# Altium footprint library common.PcbLib: 30 footprints (part 1 of 2)
Each footprint in its own frame and in the unit in brackets; x right, y up, seen from the top. Pads: shape width x height; smd on the part's side, far side on the other; paste and mask are expansions set on the pad; w line width, h text height; cw(c..) or ccw(c..) is an arc to the next point about the centre after c.
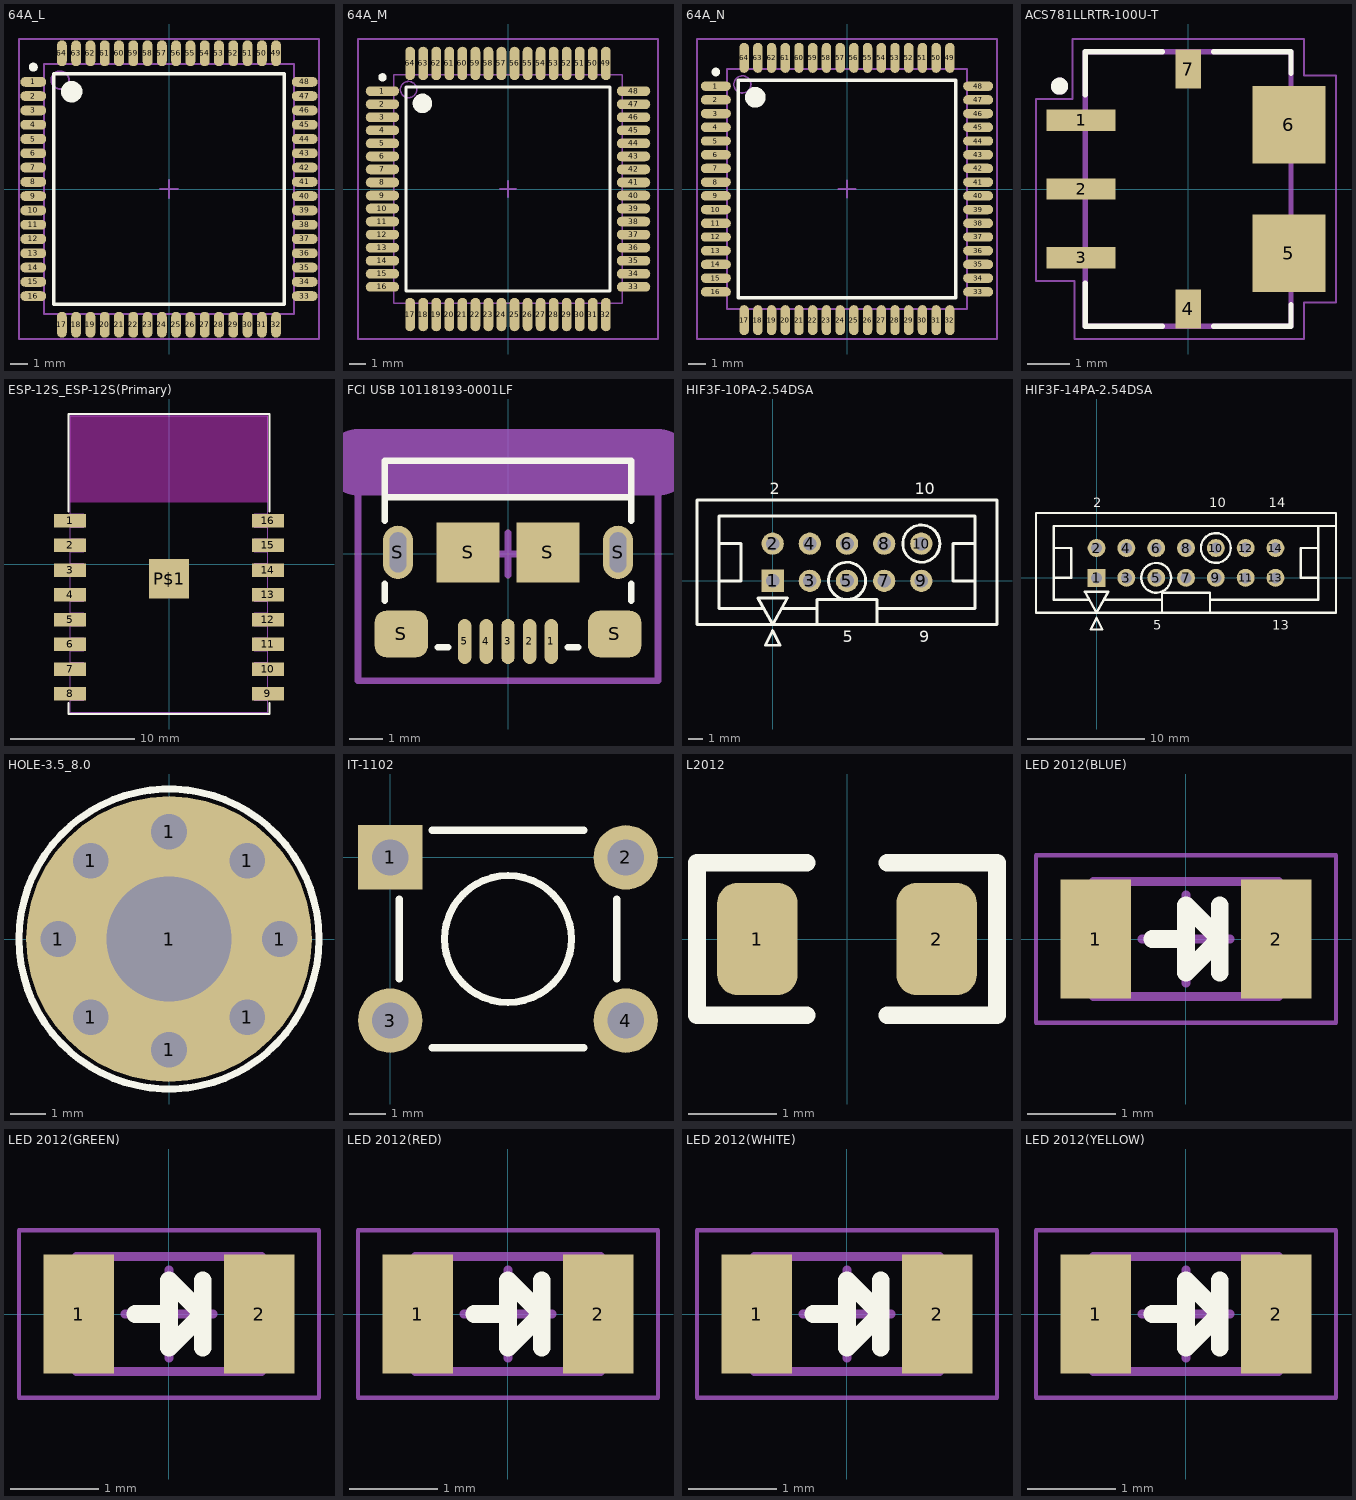
[diagram p0: the footprints below, top view; thin cyan lines are the x and y axes]

## 64A_L [mm] "64-Pin Thin Quad Flat Pack 0.8 mm Pitch, IPC High Density"
height 1.2
pads (64):
  oval 1.45x0.55 smd: 1(-7.6,6) 2(-7.6,5.2) 3(-7.6,4.4) 4(-7.6,3.6) 5(-7.6,2.8) 6(-7.6,2) 7(-7.6,1.2) 8(-7.6,0.4) 9(-7.6,-0.4) 10(-7.6,-1.2) 11(-7.6,-2) 12(-7.6,-2.8) 13(-7.6,-3.6) 14(-7.6,-4.4) 15(-7.6,-5.2) 16(-7.6,-6) 33(7.6,-6) 34(7.6,-5.2) 35(7.6,-4.4) 36(7.6,-3.6) 37(7.6,-2.8) 38(7.6,-2) 39(7.6,-1.2) 40(7.6,-0.4) 41(7.6,0.4) 42(7.6,1.2) 43(7.6,2) 44(7.6,2.8) 45(7.6,3.6) 46(7.6,4.4) 47(7.6,5.2) 48(7.6,6)
  oval 0.55x1.45 smd: 17(-6,-7.6) 18(-5.2,-7.6) 19(-4.4,-7.6) 20(-3.6,-7.6) 21(-2.8,-7.6) 22(-2,-7.6) 23(-1.2,-7.6) 24(-0.4,-7.6) 25(0.4,-7.6) 26(1.2,-7.6) 27(2,-7.6) 28(2.8,-7.6) 29(3.6,-7.6) 30(4.4,-7.6) 31(5.2,-7.6) 32(6,-7.6) 49(6,7.6) 50(5.2,7.6) 51(4.4,7.6) 52(3.6,7.6) 53(2.8,7.6) 54(2,7.6) 55(1.2,7.6) 56(0.4,7.6) 57(-0.4,7.6) 58(-1.2,7.6) 59(-2,7.6) 60(-2.8,7.6) 61(-3.6,7.6) 62(-4.4,7.6) 63(-5.2,7.6) 64(-6,7.6)
Top Overlay:
  circle w0.25: c-7.6,6.825 r0.125
  circle w0.6: c-5.45,5.45 r0.3
  lines w0.2: -6.45,-6.45 -6.45,6.45 6.45,6.45 6.45,-6.45 -6.45,-6.45
Mechanical 13:
  circle w0.1: c-6.1,6.1 r0.5
  lines w0.1: -7,-7 -7,7 7,7 7,-7 -7,-7
Mechanical 15:
  lines w0.1: -0.5,0 0.5,0 ; 0,-0.5 0,0.5 ; -8.4,-8.4 -8.4,8.4 8.4,8.4 8.4,-8.4 -8.4,-8.4
3D body: height 1.2, standoff 0, extent -7,-7 7,7

## 64A_M [mm] "64-Pin Thin Quad Flat Pack 0.8 mm Pitch, IPC Low Density"
height 1.2
pads (64):
  oval 2.05x0.6 smd: 1(-7.7,6) 2(-7.7,5.2) 3(-7.7,4.4) 4(-7.7,3.6) 5(-7.7,2.8) 6(-7.7,2) 7(-7.7,1.2) 8(-7.7,0.4) 9(-7.7,-0.4) 10(-7.7,-1.2) 11(-7.7,-2) 12(-7.7,-2.8) 13(-7.7,-3.6) 14(-7.7,-4.4) 15(-7.7,-5.2) 16(-7.7,-6) 33(7.7,-6) 34(7.7,-5.2) 35(7.7,-4.4) 36(7.7,-3.6) 37(7.7,-2.8) 38(7.7,-2) 39(7.7,-1.2) 40(7.7,-0.4) 41(7.7,0.4) 42(7.7,1.2) 43(7.7,2) 44(7.7,2.8) 45(7.7,3.6) 46(7.7,4.4) 47(7.7,5.2) 48(7.7,6)
  oval 0.6x2.05 smd: 17(-6,-7.7) 18(-5.2,-7.7) 19(-4.4,-7.7) 20(-3.6,-7.7) 21(-2.8,-7.7) 22(-2,-7.7) 23(-1.2,-7.7) 24(-0.4,-7.7) 25(0.4,-7.7) 26(1.2,-7.7) 27(2,-7.7) 28(2.8,-7.7) 29(3.6,-7.7) 30(4.4,-7.7) 31(5.2,-7.7) 32(6,-7.7) 49(6,7.7) 50(5.2,7.7) 51(4.4,7.7) 52(3.6,7.7) 53(2.8,7.7) 54(2,7.7) 55(1.2,7.7) 56(0.4,7.7) 57(-0.4,7.7) 58(-1.2,7.7) 59(-2,7.7) 60(-2.8,7.7) 61(-3.6,7.7) 62(-4.4,7.7) 63(-5.2,7.7) 64(-6,7.7)
Top Overlay:
  circle w0.25: c-7.7,6.85 r0.125
  circle w0.6: c-5.25,5.25 r0.3
  lines w0.2: -6.25,-6.25 -6.25,6.25 6.25,6.25 6.25,-6.25 -6.25,-6.25
Mechanical 13:
  circle w0.1: c-6.1,6.1 r0.5
  lines w0.1: -7,-7 -7,7 7,7 7,-7 -7,-7
Mechanical 15:
  lines w0.1: -0.5,0 0.5,0 ; 0,-0.5 0,0.5 ; -9.2,-9.2 -9.2,9.2 9.2,9.2 9.2,-9.2 -9.2,-9.2
3D body: height 1.2, standoff 0, extent -7,-7 7,7

## 64A_N [mm] "64-Pin Thin Quad Flat Pack 0.8 mm Pitch, IPC Medium Density"
height 1.2
pads (64):
  oval 1.75x0.55 smd: 1(-7.65,6) 2(-7.65,5.2) 3(-7.65,4.4) 4(-7.65,3.6) 5(-7.65,2.8) 6(-7.65,2) 7(-7.65,1.2) 8(-7.65,0.4) 9(-7.65,-0.4) 10(-7.65,-1.2) 11(-7.65,-2) 12(-7.65,-2.8) 13(-7.65,-3.6) 14(-7.65,-4.4) 15(-7.65,-5.2) 16(-7.65,-6) 33(7.65,-6) 34(7.65,-5.2) 35(7.65,-4.4) 36(7.65,-3.6) 37(7.65,-2.8) 38(7.65,-2) 39(7.65,-1.2) 40(7.65,-0.4) 41(7.65,0.4) 42(7.65,1.2) 43(7.65,2) 44(7.65,2.8) 45(7.65,3.6) 46(7.65,4.4) 47(7.65,5.2) 48(7.65,6)
  oval 0.55x1.75 smd: 17(-6,-7.65) 18(-5.2,-7.65) 19(-4.4,-7.65) 20(-3.6,-7.65) 21(-2.8,-7.65) 22(-2,-7.65) 23(-1.2,-7.65) 24(-0.4,-7.65) 25(0.4,-7.65) 26(1.2,-7.65) 27(2,-7.65) 28(2.8,-7.65) 29(3.6,-7.65) 30(4.4,-7.65) 31(5.2,-7.65) 32(6,-7.65) 49(6,7.65) 50(5.2,7.65) 51(4.4,7.65) 52(3.6,7.65) 53(2.8,7.65) 54(2,7.65) 55(1.2,7.65) 56(0.4,7.65) 57(-0.4,7.65) 58(-1.2,7.65) 59(-2,7.65) 60(-2.8,7.65) 61(-3.6,7.65) 62(-4.4,7.65) 63(-5.2,7.65) 64(-6,7.65)
Top Overlay:
  circle w0.6: c-5.35,5.35 r0.3
  circle w0.25: c-7.65,6.825 r0.125
  lines w0.2: -6.35,-6.35 6.35,-6.35 6.35,6.35 -6.35,6.35 -6.35,-6.35
Mechanical 13:
  circle w0.1: c-6.1,6.1 r0.5
  lines w0.1: -7,-7 7,-7 7,7 -7,7 -7,-7
Mechanical 15:
  lines w0.1: -0.5,0 0.5,0 ; 0,-0.5 0,0.5 ; -8.75,-8.75 8.75,-8.75 8.75,8.75 -8.75,8.75 -8.75,-8.75
3D body: height 1.2, standoff 0, extent -7,-7 7,7

## ACS781LLRTR-100U-T [mm]
pads (7):
  rect 1.6x0.5 smd: 1(-2.5,1.6) 2(-2.5,0) 3(-2.5,-1.6)
  rect 0.6x0.9 smd: 4(0,-2.8) 7(0,2.8)
  rect 1.7x1.8 smd: 5(2.35,-1.5) 6(2.35,1.5)
Top Overlay:
  circle w0.2: c-3,2.4 r0.1
  lines w0.127: -2.4,-2.2 -2.4,-3.2 -0.6,-3.2 ; -2.4,2.2 -2.4,3.2 -0.6,3.2 ; 0.6,-3.2 2.4,-3.2 2.4,-2.7 ; 0.6,3.2 2.4,3.2 2.4,2.7
Mechanical 4:
  circle w0.2: c-3,2.4 r0.1
  circle w0.2: c-3,2.4 r0.1
  lines w0.127: -2.4,-3.2 -2.4,3.2 ; -2.4,-3.2 2.4,-3.2 ; -2.4,-3.2 -2.4,3.2 ; -2.4,-3.2 2.4,-3.2 ; -2.4,3.2 2.4,3.2 ; -2.4,3.2 2.4,3.2 ; 2.4,-3.2 2.4,3.2 ; 2.4,-3.2 2.4,3.2
Mechanical 16:
  lines w0.05: -3.55,-2.15 -3.55,2.1 -2.7,2.1 -2.7,3.5 2.7,3.5 2.7,2.65 3.45,2.65 3.45,-2.65 2.7,-2.65 2.7,-3.5 -2.65,-3.5 -2.65,-2.15 -3.55,-2.15
3D body "acs781.STP": height 1.5, standoff 0, extent -3.2,-3.2 3.2,3.2

## ESP-12S_ESP-12S(Primary) [mm]
pads (17):
  rect 2.6x1.1 smd: 1(-8,3.5) 2(-8,1.5) 3(-8,-0.5) 4(-8,-2.5) 5(-8,-4.5) 6(-8,-6.5) 7(-8,-8.5) 8(-8,-10.5) 9(8,-10.5) 10(8,-8.5) 11(8,-6.5) 12(8,-4.5) 13(8,-2.5) 14(8,-0.5) 15(8,1.5) 16(8,3.5)
  rect 3.2x3.2 smd: P$1(0,-1.2)
Top Overlay:
  lines w0.178: -8.127,-11.241 -8.127,-12.127 8.127,-12.127 8.127,-11.241 ; -8.127,4.256 -8.127,12.127 8.127,12.127 8.127,4.256
Top Paste:
  region: -1.016,-0.159 0.984,-0.159 0.984,-2.159 -1.016,-2.159
Keep-Out Layer:
  region: -8,5 8,5 8,12 -8,12
  region: 8,5 -8,5 -8,12 8,12
  region: -8,5 8,5 8,12 -8,12
  region: 8,5 -8,5 -8,12 8,12
  region: -8,5 8,5 8,12 -8,12
  region: 8,5 -8,5 -8,12 8,12
Mechanical 4:
  region: -8,-9.95 -6.9,-9.95 -6.9,-11.05 -8,-11.05
  region: -8,-7.95 -6.9,-7.95 -6.9,-9.05 -8,-9.05
  region: -8,-5.95 -6.9,-5.95 -6.9,-7.05 -8,-7.05
  region: -8,-3.95 -6.9,-3.95 -6.9,-5.05 -8,-5.05
  region: -8,-1.95 -6.9,-1.95 -6.9,-3.05 -8,-3.05
  region: -8,0.05 -6.9,0.05 -6.9,-1.05 -8,-1.05
  region: -8,2.05 -6.9,2.05 -6.9,0.95 -8,0.95
  region: -8,4.05 -6.9,4.05 -6.9,2.95 -8,2.95
  region: 6.9,-9.95 8,-9.95 8,-11.05 6.9,-11.05
  region: 6.9,-7.95 8,-7.95 8,-9.05 6.9,-9.05
  region: 6.9,-5.95 8,-5.95 8,-7.05 6.9,-7.05
  region: 6.9,-3.95 8,-3.95 8,-5.05 6.9,-5.05
  region: 6.9,-1.95 8,-1.95 8,-3.05 6.9,-3.05
  region: 6.9,0.05 8,0.05 8,-1.05 6.9,-1.05
  region: 6.9,2.05 8,2.05 8,0.95 6.9,0.95
  region: 6.9,4.05 8,4.05 8,2.95 6.9,2.95
  region: -8,-9.95 -6.9,-9.95 -6.9,-11.05 -8,-11.05
  region: -8,-7.95 -6.9,-7.95 -6.9,-9.05 -8,-9.05
  region: -8,-5.95 -6.9,-5.95 -6.9,-7.05 -8,-7.05
  region: -8,-3.95 -6.9,-3.95 -6.9,-5.05 -8,-5.05
  region: -8,-1.95 -6.9,-1.95 -6.9,-3.05 -8,-3.05
  region: -8,0.05 -6.9,0.05 -6.9,-1.05 -8,-1.05
  region: -8,2.05 -6.9,2.05 -6.9,0.95 -8,0.95
  region: -8,4.05 -6.9,4.05 -6.9,2.95 -8,2.95
  region: 6.9,-9.95 8,-9.95 8,-11.05 6.9,-11.05
  region: 6.9,-7.95 8,-7.95 8,-9.05 6.9,-9.05
  region: 6.9,-5.95 8,-5.95 8,-7.05 6.9,-7.05
  region: 6.9,-3.95 8,-3.95 8,-5.05 6.9,-5.05
  region: 6.9,-1.95 8,-1.95 8,-3.05 6.9,-3.05
  region: 6.9,0.05 8,0.05 8,-1.05 6.9,-1.05
  region: 6.9,2.05 8,2.05 8,0.95 6.9,0.95
  region: 6.9,4.05 8,4.05 8,2.95 6.9,2.95
  lines w0.003: -8,-12 -8,12 ; -8,-12 8,-12 ; -8,-12 -8,12 ; -8,-12 8,-12 ; -8,12 8,12 ; -8,12 8,12 ; 8,-12 8,12 ; 8,-12 8,12
3D body: height 0.25, standoff 0, extent 2.54,1.016 2.54,1.016
3D body "User Library-esp-12s.STEP": height -0.08, standoff -3.2, extent -7.999,-12 8.001,12

## FCI USB 10118193-0001LF [mm] "USB 2.0 Type B Micro"
height 3.1
pads (11):
  oval 0.4x1.35 smd: 1(1.3,-2.625) 2(0.65,-2.625) 3(0,-2.625) 4(-0.65,-2.625) 5(-1.3,-2.625)
  oval 0.9x1.6 hole 0.5 slot 1.2 at 90 deg: S(-3.3,0.05) S(3.3,0.05)
  rrect50% 1.6x1.4 smd: S(-3.2,-2.4) S(3.2,-2.4)
  rect 1.9x1.8 smd: S(-1.2,0.05) S(1.2,0.05)
Top Overlay:
  lines w0.2: -3.7,-1.4 -3.7,-0.9 ; -3.7,1 -3.7,1.7 ; -2.1,-2.8 -1.8,-2.8 ; 1.8,-2.8 2.1,-2.8 ; 3.7,-1.4 3.7,-0.9 ; 3.7,1 3.7,1.7 ; -3.7,1.7 3.7,1.7 ; -3.7,1.7 -3.7,2.8 3.7,2.8 3.7,1.7
Mechanical 15:
  lines w0.2: -0.635,0 0.635,0 ; 0,-0.635 0,0.635 ; -4.5,-3.8 -4.5,3.2 4.5,3.2 4.5,-3.8 -4.5,-3.8
Mechanical 31:
  lines w2: -4.5,2.754 0,2.754 4.5,2.754
3D body "FCI USB 10118193-0001lfc.STEP": height 2.78, standoff -0.82, extent -3.929,-2.9 3.928,2.76

## HIF3F-10PA-2.54DSA [mil]
pads (10):
  rect 60x60 hole 37: 1(0,0)
  round 60 hole 37: 2(0,100) 3(100,0) 4(100,100) 5(200,0) 6(200,100) 7(300,0) 8(300,100) 9(400,0) 10(400,100)
Top Overlay:
  circle w7.87: c200,0 r50
  circle w7.87: c400,100 r50
  lines w7.87: -144.49,0 -85.43,0 -85.43,100 -144.49,100 ; -24.02,-74.02 -144.49,-74.02 -144.49,174.02 544.49,174.02 544.49,-74.02 280.71,-74.02 ; 24.02,-74.02 119.29,-74.02 ; 119.29,-117.32 119.29,-50 280.71,-50 280.71,-117.32 ; 544.49,0 485.43,0 485.43,100 544.49,100 ; -203.54,-117.32 603.54,-117.32 603.54,217.32 -203.54,217.32 -203.54,-117.32 ; -39.37,-46.46 0,-117.32 39.37,-46.46 -39.37,-46.46 ; -19.68,-173.23 19.68,-173.23 0,-133.86 -19.68,-173.23
  text "5" at 188.98,-165.35 h31.5
  text "10" at 381.89,232.28 h31.5
  text "9" at 393.7,-165.35 h31.5
  text "2" at -7.87,232.28 h31.5
3D body "HIF3F-10PA.step": height 352, standoff -148, extent -200,-125 600,225

## HIF3F-14PA-2.54DSA [mil]
pads (14):
  rect 60x60 hole 37: 1(0,0)
  round 60 hole 37: 2(0,100) 3(100,0) 4(100,100) 5(200,0) 6(200,100) 7(300,0) 8(300,100) 9(400,0) 10(400,100) 11(500,0) 12(500,100) 13(600,0) 14(600,100)
Top Overlay:
  circle w7.87: c200,0 r50
  circle w7.87: c400,100 r50
  lines w7.87: -144.09,0 -85.04,0 -85.04,100 -144.09,100 ; -24.02,-74.02 -144.09,-74.02 -144.09,174.02 803.15,174.02 ; 24.02,-74.02 219.29,-74.02 ; 219.29,-117.32 219.29,-50 380.71,-50 380.71,-117.32 ; 380.71,-74.02 744.09,-74.02 744.09,174.02 ; 744.09,0 685.04,0 685.04,100 744.09,100 ; -203.15,-117.32 803.15,-117.32 803.15,217.32 -203.15,217.32 -203.15,-117.32 ; -39.37,-46.46 0,-117.32 39.37,-46.46 -39.37,-46.46 ; -19.68,-173.23 19.68,-173.23 0,-133.86 -19.68,-173.23
  text "13" at 590,-175 h31.5
  text "14" at 577.95,236.22 h31.5
  text "5" at 190,-175 h31.5
  text "10" at 377.95,236.22 h31.5
  text "2" at -11.81,236.22 h31.5

## HOLE-3.5_8.0 [mm]
pads (9):
  round 1.5 hole 1: 1(-3.1,0) 1(-2.192,-2.192) 1(-2.192,2.192) 1(0,-3.1) 1(0,3) 1(2.192,-2.192) 1(2.192,2.192) 1(3.1,0)
  round 8 hole 3.5: 1(0,0)
Top Overlay:
  circle w0.2: c0,0 r4.2

## IT-1102 [mm]
height 4.3
pads (4):
  rect 1.778x1.778 hole 1: 1(0,0)
  round 1.778 hole 1: 2(6.5,0) 3(0,-4.5) 4(6.5,-4.5)
Top Overlay:
  circle w0.2: c3.25,-2.25 r1.75
  lines w0.2: 0.25,-3.35 0.25,-1.15 ; 1.15,-5.25 5.35,-5.25 ; 1.15,0.75 5.35,0.75 ; 6.25,-3.35 6.25,-1.15
3D body "IT-1102-Yale.STEP": height 4.91, standoff -2.33, extent -0.15,-5.251 6.65,0.75

## L2012 [mil]
height 234.65
pads (2):
  rrect50% 36x50 smd: 1(-40,0) 2(40,0)
Top Overlay:
  lines w7.87: -18,-34 -67,-34 -67,34 -18,34 ; 18,-34 67,-34 67,34 18,34
3D body "L2012.STEP": height 34.8, standoff -0.63, extent -39.37,-24.6 39.37,24.61

## LED 2012(BLUE) [mm] "LED, 2-Leads, Body 2.00x1.20mm, IPC Medium Density"
height 0.5
pads (2):
  rect 0.8x1.35 smd: 1(-1.025,0) 2(1.025,0)
Top Overlay:
  lines w0.2: -0.381,0 0,0 ; 0.381,-0.381 0.381,0.381 ; 0,-0.381 0.381,0 0,0.381 0,-0.381
Mechanical 13:
  lines w0.1: -1.05,-0.65 1.05,-0.65 1.05,0.65 -1.05,0.65 -1.05,-0.65
Mechanical 15:
  lines w0.05: -1.7,-0.95 1.7,-0.95 1.7,0.95 -1.7,0.95 -1.7,-0.95
  lines w0.1: -0.5,0 0.5,0 ; 0,-0.5 0,0.5
3D body "LED 0805 Blue.step": height 0.8, standoff 0, extent -1.05,-0.675 1.05,0.675

## LED 2012(GREEN) [mm] "LED, 2-Leads, Body 2.00x1.20mm, IPC Medium Density"
height 0.5
pads (2):
  rect 0.8x1.35 smd: 1(-1.025,0) 2(1.025,0)
Top Overlay:
  lines w0.2: -0.381,0 0,0 ; 0.381,-0.381 0.381,0.381 ; 0,-0.381 0,0.381 0.381,0 0,-0.381
Mechanical 13:
  lines w0.1: -1.05,-0.65 -1.05,0.65 1.05,0.65 1.05,-0.65 -1.05,-0.65
Mechanical 15:
  lines w0.05: -1.7,-0.95 -1.7,0.95 1.7,0.95 1.7,-0.95 -1.7,-0.95
  lines w0.1: -0.5,0 0.5,0 ; 0,-0.5 0,0.5
3D body "LED 0805 GRE.step": height 1.1, standoff 0, extent -1.01,-0.625 1.01,0.625

## LED 2012(RED) [mm] "LED, 2-Leads, Body 2.00x1.20mm, IPC Medium Density"
height 0.5
pads (2):
  rect 0.8x1.35 smd: 1(-1.025,0) 2(1.025,0)
Top Overlay:
  lines w0.2: -0.381,0 0,0 ; 0.381,-0.381 0.381,0.381 ; 0,-0.381 0.381,0 0,0.381 0,-0.381
Mechanical 13:
  lines w0.1: -1.05,-0.65 1.05,-0.65 1.05,0.65 -1.05,0.65 -1.05,-0.65
Mechanical 15:
  lines w0.05: -1.7,-0.95 1.7,-0.95 1.7,0.95 -1.7,0.95 -1.7,-0.95
  lines w0.1: -0.5,0 0.5,0 ; 0,-0.5 0,0.5
3D body "LED 0805 Red.step": height 1.1, standoff 0, extent -1.01,-0.625 1.01,0.625

## LED 2012(WHITE) [mm] "LED, 2-Leads, Body 2.00x1.20mm, IPC Medium Density"
height 0.5
pads (2):
  rect 0.8x1.35 smd: 1(-1.025,0) 2(1.025,0)
Top Overlay:
  lines w0.2: -0.381,0 0,0 ; 0.381,-0.381 0.381,0.381 ; 0,-0.381 0.381,0 0,0.381 0,-0.381
Mechanical 13:
  lines w0.1: -1.05,-0.65 1.05,-0.65 1.05,0.65 -1.05,0.65 -1.05,-0.65
Mechanical 15:
  lines w0.05: -1.7,-0.95 1.7,-0.95 1.7,0.95 -1.7,0.95 -1.7,-0.95
  lines w0.1: -0.5,0 0.5,0 ; 0,-0.5 0,0.5
3D body "LED 0805 White.step": height 1.1, standoff 0, extent -1.01,-0.625 1.01,0.625

## LED 2012(YELLOW) [mm] "LED, 2-Leads, Body 2.00x1.20mm, IPC Medium Density"
height 0.5
pads (2):
  rect 0.8x1.35 smd: 1(-1.025,0) 2(1.025,0)
Top Overlay:
  lines w0.2: -0.381,0 0,0 ; 0.381,-0.381 0.381,0.381 ; 0,-0.381 0.381,0 0,0.381 0,-0.381
Mechanical 13:
  lines w0.1: -1.05,-0.65 1.05,-0.65 1.05,0.65 -1.05,0.65 -1.05,-0.65
Mechanical 15:
  lines w0.05: -1.7,-0.95 1.7,-0.95 1.7,0.95 -1.7,0.95 -1.7,-0.95
  lines w0.1: -0.5,0 0.5,0 ; 0,-0.5 0,0.5
3D body "LED 0805 YEL.step": height 1.1, standoff 0, extent -1.01,-0.625 1.01,0.625